# Altium footprint library 00.PcbLib: 150 footprints (part 9 of 10)
Each footprint in its own frame and in the unit in brackets; x right, y up, seen from the top. Pads: shape width x height; smd on the part's side, far side on the other; paste and mask are expansions set on the pad; w line width, h text height; cw(c..) or ccw(c..) is an arc to the next point about the centre after c.
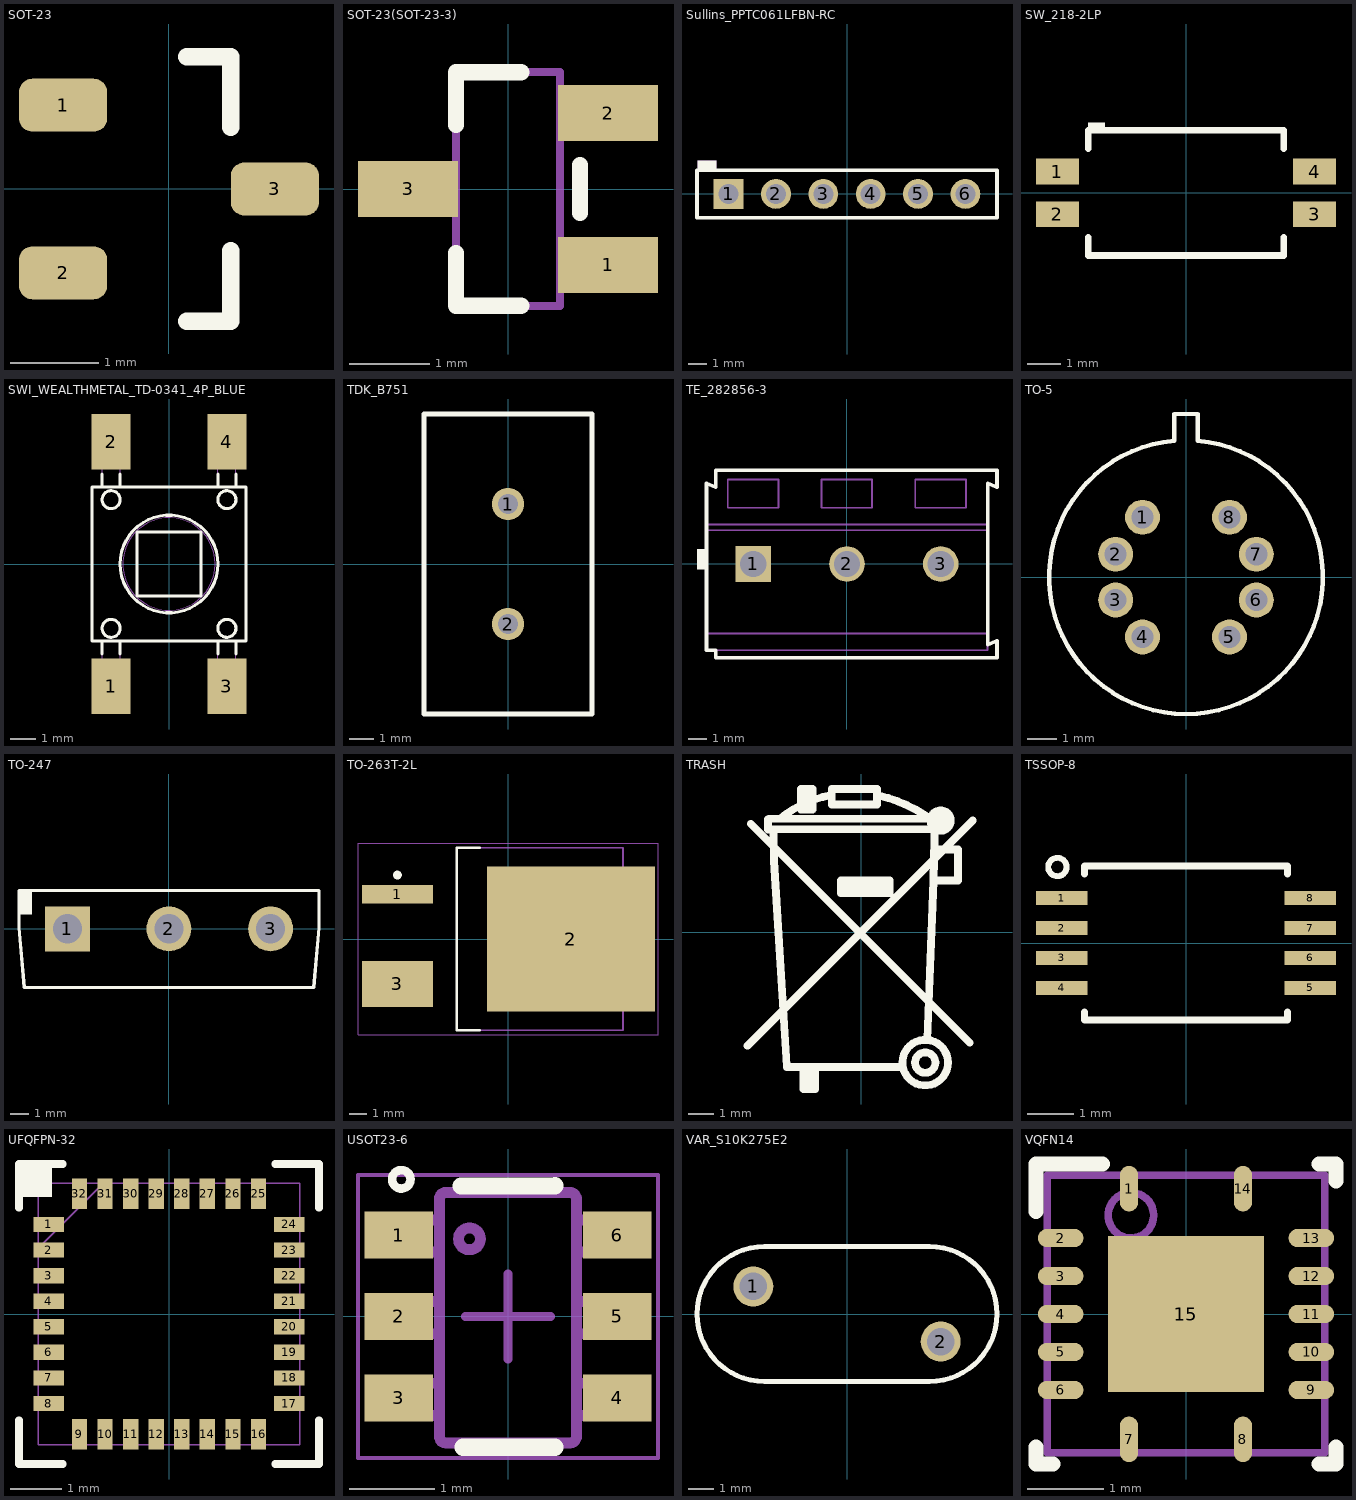
[diagram p8: the footprints below, top view; thin cyan lines are the x and y axes]

## SOT-23 [mm]
pads (3):
  rrect50% 1x0.6 smd: 1(-1.2,0.95) 2(-1.2,-0.95) 3(1.2,0)
Top Overlay:
  lines w0.2: 0.2,-1.5 0.7,-1.5 0.7,-0.7 ; 0.2,1.5 0.7,1.5 0.7,0.7
3D body "SW3dPS-sot-3p290x130ll237h100.STEP": height 1, standoff 0, extent -1.16,-1.45 1.21,1.45

## SOT-23(SOT-23-3) [mm]
height 1.1
pads (3):
  rect 1.25x0.7 smd: 1(1.25,-0.95) 2(1.25,0.95) 3(-1.25,0)
Top Overlay:
  lines w0.2: 0.9,-0.3 0.9,0.3
  lines w0.203: -0.65,-0.8 -0.65,-1.46 0.165,-1.46 ; 0.165,1.46 -0.65,1.46 ; -0.65,0.8 -0.65,1.46 ; -0.65,0.8 -0.65,1.46 ; -0.65,0.8 -0.65,1.46
Top 3D Body:
  lines w0.1: -0.65,-1.46 -0.65,1.46 ; -0.65,-1.46 0.65,-1.46 ; -0.65,-1.46 -0.65,1.46 ; -0.65,-1.46 0.65,-1.46 ; -0.65,-1.46 0.65,-1.46 ; -0.65,-1.46 -0.65,1.46 ; -0.65,1.46 0.65,1.46 ; -0.65,1.46 0.65,1.46 ; -0.65,1.46 0.65,1.46 ; 0.65,-1.46 0.65,1.46 ; 0.65,-1.46 0.65,1.46 ; 0.65,-1.46 0.65,1.46
3D body "SOT-23.step": height 1.3, standoff 0, extent -1.5,-1.5 1.5,1.5

## Sullins_PPTC061LFBN-RC [mm]
pads (6):
  rect 1.6x1.6 hole 1.07: 1(-6.35,0)
  round 1.6 hole 1.07: 2(-3.81,0) 3(-1.27,0) 4(1.27,0) 5(3.81,0) 6(6.35,0)
Top Overlay:
  rectangle: -8.024,1.317 -7.008,1.8
  lines w0.2: -8.045,-1.27 -8.045,1.27 8.045,1.27 8.045,-1.27 -8.045,-1.27
Top Courtyard:
  rectangle: -8.024,1.317 -7.008,1.8
  lines w0.1: -8.045,-1.27 -8.045,1.27 8.045,1.27 8.045,-1.27 -8.045,-1.27
3D body: height 3.3, standoff -3.2, extent 5.96,-0.227 6.772,0.231
3D body: height 3.3, standoff -3.2, extent 3.407,-0.217 4.22,0.24
3D body: height 3.3, standoff -3.2, extent 0.884,-0.237 1.696,0.221
3D body: height 3.3, standoff -3.2, extent -1.676,-0.227 -0.864,0.231
3D body: height 3.3, standoff -3.2, extent -4.216,-0.227 -3.404,0.231
3D body: height 3.3, standoff -3.2, extent -6.77,-0.235 -5.95,0.223
3D body: height 8.53, standoff 8.48, extent 5.842,-0.506 6.858,0.51
3D body: height 8.53, standoff 8.48, extent 3.302,-0.506 4.318,0.51
3D body: height 8.53, standoff 8.48, extent 0.764,-0.516 1.78,0.5
3D body: height 8.53, standoff 8.48, extent -1.778,-0.506 -0.762,0.51
3D body: height 8.5, standoff 0, extent -8.1,-1.3 8.1,1.3
3D body: height 8.53, standoff 8.48, extent -6.856,-0.506 -5.84,0.51
3D body: height 8.53, standoff 8.48, extent -4.318,-0.506 -3.302,0.51

## SW_218-2LP [mm]
pads (4):
  rect 1.27x0.76 smd: 1(-3.81,0.635) 2(-3.81,-0.635) 3(3.81,-0.635) 4(3.81,0.635)
Top Overlay:
  rectangle: -2.899,1.855 -2.399,2.09
  lines w0.2: -2.9,-1.31 -2.9,-1.855 2.9,-1.855 2.9,-1.31 ; -2.9,1.31 -2.9,1.855 2.9,1.855 2.9,1.31
3D body "218-2LPST.stp": height 2.62, standoff 0, extent -4.22,-1.855 4.22,1.855

## SWI_WEALTHMETAL_TD-0341_4P_BLUE [mm]
pads (4):
  rect 1.52x2.16 smd mask+0.05: 1(-2.25,-4.75) 2(-2.25,4.75) 3(2.25,-4.75) 4(2.25,4.75)
Top Overlay:
  circle w0.12: c0,0 r1.9
  circle w0.12: c2.25,-2.5 r0.35
  circle w0.12: c-2.25,-2.5 r0.35
  circle w0.12: c2.25,2.5 r0.35
  circle w0.12: c-2.25,2.5 r0.35
  lines w0.12: -2.6,-3.5 -2.6,-3 ; -2.6,3 -2.6,3.5 ; -1.9,-3.5 -1.9,-3 ; -1.9,3 -1.9,3.5 ; 1.9,-3.5 1.9,-3 ; 1.9,3 1.9,3.5 ; 2.6,-3.5 2.6,-3 ; 2.6,3 2.6,3.5 ; -3,-3 3,-3 3,3 -3,3 -3,-3 ; -1.25,-1.25 -1.25,1.25 1.25,1.25 1.25,-1.25 -1.25,-1.25
Bottom 3D Body:
  circle w0.01: c2.25,-2.5 r0.35
  circle w0.01: c-2.25,-2.5 r0.35
  circle w0.01: c2.25,2.5 r0.35
  circle w0.01: c-2.25,2.5 r0.35
  circle w0.01: c0,0 r1.8
  circle w0.01: c0,0 r1.9
  lines w0.01: -2.6,-3 -2.6,-5.15 -1.9,-5.15 -1.9,-3 ; -2.6,3 -2.6,5.15 -1.9,5.15 -1.9,3 ; 1.9,-3 1.9,-5.15 2.6,-5.15 2.6,-3 ; 1.9,3 1.9,5.15 2.6,5.15 2.6,3 ; -3,-3 -3,3 3,3 3,-3 -3,-3 ; -1.25,-1.25 1.25,-1.25 1.25,1.25 0.45,1.25 -1.25,1.25 -1.25,-1.25
3D body: height 1.1, standoff 0, extent -2.6,4.1 -1.9,4.2
3D body: height 1.2, standoff 1.1, extent -2.6,3 -1.9,4.2
3D body: height 1.1, standoff 0, extent 1.9,4.1 2.6,4.2
3D body: height 1.1, standoff 0, extent 1.9,-4.2 2.6,-4.1
3D body: height 1.1, standoff 0, extent -2.6,-4.2 -1.9,-4.1
3D body: height 1.2, standoff 1.1, extent 1.9,3 2.6,4.2
3D body: height 1.2, standoff 1.1, extent 1.9,-4.2 2.6,-3
3D body: height 1.2, standoff 1.1, extent -2.6,-4.2 -1.9,-3
3D body: height 4.85, standoff 3.7, extent -1.7,-1.696 1.7,1.697
3D body: height 7.55, standoff 5.85, extent -1.2,-1.2 1.2,1.2
3D body: height 5.85, standoff 4.85, extent -1,-1 1,1
3D body: height 3.7, standoff 0, extent -2.999,-2.999 2.999,2.999
3D body: height 0.1, standoff 0, extent -2.6,4.2 -1.9,5.15
3D body: height 0.1, standoff 0, extent 1.9,4.2 2.6,5.15
3D body: height 0.1, standoff 0, extent -2.6,-5.15 -1.9,-4.2
3D body: height 0.1, standoff 0, extent 1.9,-5.15 2.6,-4.2

## TDK_B751 [mm]
pads (2):
  round 1.35 hole 0.85: 1(0,2.5) 2(0,-2.5)
Top Overlay:
  lines w0.2: -3.5,-6.25 -3.5,6.25 3.5,6.25 3.5,-6.25 -3.5,-6.25
3D body: height 4.4, standoff 3.8, extent -2.849,-2.8 -2.252,-2.203
3D body: height 11.1, standoff 4.1, extent -3.483,-3.485 3.483,3.485
3D body: height 2.9, standoff 2.3, extent -2.848,-2.8 -2.251,-2.203
3D body: height 4.1, standoff 2.6, extent -2.85,-2.8 -2.253,-2.201
3D body: height 4.1, standoff 2.6, extent 2.253,2.201 2.85,2.8
3D body: height 4.4, standoff 3.8, extent 2.252,2.203 2.849,2.8
3D body: height 16.49, standoff 4.01, extent -1.5,-6.201 1.5,6.25
3D body: height 0.3, standoff -0.3, extent -0.297,2.201 0.3,2.799
3D body: height 2.83, standoff -0.21, extent -0.248,2.201 2.791,2.8
3D body: height 2.9, standoff 2.3, extent 2.252,2.203 2.849,2.8
3D body: height 0, standoff -2.5, extent -0.297,2.201 0.3,2.8
3D body: height 7.14, standoff 3.89, extent 2.252,-0.502 2.85,2.75
3D body: height 7.14, standoff 3.89, extent -2.85,-2.75 -2.252,0.502
3D body: height 0, standoff -2.5, extent -0.3,-2.8 0.297,-2.201
3D body: height 2.83, standoff -0.21, extent -2.791,-2.8 0.248,-2.201
3D body: height 0.3, standoff -0.3, extent -0.3,-2.799 0.297,-2.201

## TE_282856-3 [mm]
pads (3):
  rect 1.9x1.9 hole 1.4: 1(-5,0)
  round 1.9 hole 1.4: 2(0,0) 3(5,0)
Top Overlay:
  rectangle: -8,-0.3 -7.5,0.8
  lines w0.2: -7.5,-4.6 -7,-4.6 -7,-5 8,-5 8,-4.1 7.5,-4.3 7.5,1.8 7.5,2.1 7.5,4.3 8,4.1 8,5 -7,5 -7,4.1 -7.5,4.3 -7.5,2.1 -7.5,1.8 -7.5,-3.7 -7.5,-4.6
Top Component Outline (Mech100):
  lines w0.1: 7.5,-4.3 8,-4.1 8,-5 -7,-5 -7,-4.6 ; -7.5,-3.7 7.5,-3.7 ; -7.5,-3.7 -7.5,1.8 ; -7.5,-3.7 -7.5,-4.6 -7,-4.6 ; -7.5,1.8 7.5,1.8 ; -7.5,1.8 -7.5,2.1 ; -7.5,2.1 7.5,2.1 ; -7.5,2.1 -7.5,4.3 -7,4.1 -7,5 8,5 8,4.1 7.5,4.3 7.5,2.1 ; -7,-4.6 7.5,-4.6 7.5,-3.7 ; 7.5,-3.7 7.5,1.8 ; 7.5,1.8 7.5,2.1 ; -6.358,3 -6.358,4.5 -3.658,4.5 -3.658,3 -6.358,3 ; -1.358,3 -1.358,4.5 1.342,4.5 1.342,3 -1.358,3 ; 3.642,3 6.342,3 6.342,4.5 3.642,4.5 3.642,3
3D body "c-282856-3-d-3d.stp": height 19, standoff -3.5, extent -7.5,-5 8,5

## TO-5 [mm]
pads (8):
  round 1.2 hole 0.762: 1(-1.493,2.055) 2(-2.416,0.785) 3(-2.416,-0.785) 4(-1.493,-2.055) 5(1.493,-2.055) 6(2.416,-0.785) 7(2.416,0.785) 8(1.493,2.055)
Top Overlay:
  lines w0.152: -0.4,4.7 -0.4,5.6 0.4,5.6 0.4,4.7 ; -0.399,4.683 ccw(c0,0) 0.399,4.683
3D body: height 0.5, standoff 0, extent -0.381,4.572 0.381,5.588
3D body: height 6.61, standoff 0, extent -4.191,-4.191 4.319,4.319
3D body: height 0.5, standoff 0, extent -4.7,-4.697 4.7,4.697

## TO-247 [mil]
pads (3):
  rect 95x95 hole 62: 1(-215,0)
  round 95 / inner round 74.8 / far side round 96 hole 62: 2(0,0) 3(215,0)
Top Overlay:
  rectangle: -317.51,30 -290,81.11
  lines w7: -317.51,2.37 -306.45,-124.01 306.47,-124.01 317.53,2.37 317.53,81.11 -317.51,81.11 -317.51,2.37
3D body "TO-274.stp": height 1007.29, standoff -623.42, extent -317.51,-124.01 317.53,81.11

## TO-263T-2L [mm] "D2-PAK, 3-Pads, Body 7.80x8.50mm (max), IPC Medium Density"
height 4.57
pads (3):
  rect 4x1.05 smd: 1(-6.25,2.54)
  rect 9.5x8.2 smd paste+0: 2(3.55,0)
  rect 4x2.6 smd: 3(-6.25,-2.54)
Top Overlay:
  circle w0.25: c-6.25,3.615 r0.125
  lines w0.15: -1.6,-5.15 -2.9,-5.15 -2.9,5.15 -1.6,5.15
Top 3D Body:
  lines w0.1: -2.9,-5.15 -2.9,5.15 6.5,5.15 6.5,-5.15 -2.9,-5.15
Mechanical 15:
  lines w0.05: -8.475,-5.4 -8.475,5.4 8.475,5.4 8.475,-5.4 -8.475,-5.4
  lines w0.1: -0.5,0 0.5,0 ; 0,-0.5 0,0.5
3D body "TO-263T-2L.step": height 4.82, standoff 0, extent -7.115,-5.15 8.125,5.15

## TRASH [mm]
Top Overlay:
  lines w0.305: -4.478,-4.478 4.412,4.412 ; -4.351,4.285 4.285,-4.351 ; -3.671,4.462 -3.671,4.061 2.862,4.081 ; -3.64,4.488 2.761,4.488 ; -3.457,4.061 -3.437,2.811 -2.929,-5.266 ; -3.183,4.488 cw(c-0.553,1.391) -1.202,5.402 ; -2.929,-5.317 1.592,-5.317 ; -2.726,-5.317 -2.269,-5.317 -2.269,-6.18 -1.811,-6.18 -1.811,-5.317 ; -2.167,4.945 -2.167,5.656 -2.116,5.656 ; -2.065,-6.18 -2.065,-5.317 ; -1.151,5.656 -1.151,5.047 0.627,5.047 0.627,5.656 -1.1,5.656 ; -0.795,1.795 1.135,1.795 ; 0.678,5.402 cw(c-0.555,-0.105) 2.862,4.386 ; 2.608,-4.25 2.862,2.049 ; 2.913,3.269 3.827,3.269 3.827,2.049 2.862,2.049 ; 2.913,4.488 2.862,2.049 ; 2.964,4.488 2.964,4.539 cw(c3.116,4.539) 3.269,4.539 3.269,4.335 cw(c3.167,4.335) 3.065,4.335 3.065,4.386 ; -2.37,4.843 -1.913,4.843 -1.913,5.656 -2.37,5.656 -2.37,4.843 ; -0.795,1.541 -0.795,2.049 1.135,2.049 1.135,1.541 -0.795,1.541 ; 1.633,-5.139 ccw(c2.532,-5.139) 3.431,-5.139 ccw(c2.532,-5.139) 1.633,-5.139 ; 2.131,-5.139 ccw(c2.532,-5.139) 2.933,-5.139 ccw(c2.532,-5.139) 2.131,-5.139 ; 2.74,4.412 ccw(c3.142,4.412) 3.543,4.412 ccw(c3.142,4.412) 2.74,4.412

## TSSOP-8 [mm]
pads (8):
  rect 1.118x0.3 smd paste+0 mask+0: 1(-2.7,0.975) 2(-2.7,0.325) 3(-2.7,-0.325) 4(-2.7,-0.975) 5(2.7,-0.975) 6(2.7,-0.325) 7(2.7,0.325) 8(2.7,0.975)
Top Overlay:
  circle w0.127: c-2.794,1.651 r0.2
  lines w0.152: -2.2,-1.498 -2.2,-1.676 2.2,-1.676 2.2,-1.498 ; -2.2,1.498 -2.2,1.676 2.2,1.676 2.2,1.498
3D body "User Library-TSS0P8.STEP": height 1.09, standoff 0, extent -3.14,-1.575 3.14,1.425

## UFQFPN-32 [mm]
pads (32):
  rect 0.6x0.3 smd paste-0.15 mask+0: 1(-2.35,1.75) 2(-2.35,1.25) 3(-2.35,0.75) 4(-2.35,0.25) 5(-2.35,-0.25) 6(-2.35,-0.75) 7(-2.35,-1.25) 8(-2.35,-1.75) 17(2.35,-1.75) 18(2.35,-1.25) 19(2.35,-0.75) 20(2.35,-0.25) 21(2.35,0.25) 22(2.35,0.75) 23(2.35,1.25) 24(2.35,1.75)
  rect 0.3x0.6 smd paste-0.15 mask+0: 9(-1.75,-2.35) 10(-1.25,-2.35) 11(-0.75,-2.35) 12(-0.25,-2.35) 13(0.25,-2.35) 14(0.75,-2.35) 15(1.25,-2.35) 16(1.75,-2.35) 25(1.75,2.35) 26(1.25,2.35) 27(0.75,2.35) 28(0.25,2.35) 29(-0.25,2.35) 30(-0.75,2.35) 31(-1.25,2.35) 32(-1.75,2.35)
Top Overlay:
  rectangle: -2.931,2.286 -2.286,2.931
  lines w0.152: -2.931,-2.078 -2.931,-2.931 -2.078,-2.931 ; -2.931,2.078 -2.931,2.931 -2.078,2.931 ; 2.078,-2.931 2.931,-2.931 2.931,-2.078 ; 2.078,2.931 2.931,2.931 2.931,2.078
Top Paste:
  region: -1.6,2.65 -1.9,2.65 -1.9,2.05 -1.6,2.05
  region: -1.1,2.65 -1.4,2.65 -1.4,2.05 -1.1,2.05
  region: -0.6,2.65 -0.9,2.65 -0.9,2.05 -0.6,2.05
  region: -0.1,2.65 -0.4,2.65 -0.4,2.05 -0.1,2.05
  region: 0.4,2.65 0.1,2.65 0.1,2.05 0.4,2.05
  region: 0.9,2.65 0.6,2.65 0.6,2.05 0.9,2.05
  region: 1.4,2.65 1.1,2.65 1.1,2.05 1.4,2.05
  region: 1.9,2.65 1.6,2.65 1.6,2.05 1.9,2.05
  region: 2.65,1.9 2.05,1.9 2.05,1.6 2.65,1.6
  region: 2.65,1.4 2.05,1.4 2.05,1.1 2.65,1.1
  region: 2.65,0.9 2.05,0.9 2.05,0.6 2.65,0.6
  region: 2.65,0.4 2.05,0.4 2.05,0.1 2.65,0.1
  region: 2.65,-0.1 2.05,-0.1 2.05,-0.4 2.65,-0.4
  region: 2.65,-0.6 2.05,-0.6 2.05,-0.9 2.65,-0.9
  region: 2.65,-1.1 2.05,-1.1 2.05,-1.4 2.65,-1.4
  region: 2.65,-1.6 2.05,-1.6 2.05,-1.9 2.65,-1.9
  region: 1.9,-2.05 1.6,-2.05 1.6,-2.65 1.9,-2.65
  region: 1.4,-2.05 1.1,-2.05 1.1,-2.65 1.4,-2.65
  region: 0.9,-2.05 0.6,-2.05 0.6,-2.65 0.9,-2.65
  region: 0.4,-2.05 0.1,-2.05 0.1,-2.65 0.4,-2.65
  region: -0.1,-2.05 -0.4,-2.05 -0.4,-2.65 -0.1,-2.65
  region: -0.6,-2.05 -0.9,-2.05 -0.9,-2.65 -0.6,-2.65
  region: -1.1,-2.05 -1.4,-2.05 -1.4,-2.65 -1.1,-2.65
  region: -1.6,-2.05 -1.9,-2.05 -1.9,-2.65 -1.6,-2.65
  region: -2.05,-1.6 -2.65,-1.6 -2.65,-1.9 -2.05,-1.9
  region: -2.05,-1.1 -2.65,-1.1 -2.65,-1.4 -2.05,-1.4
  region: -2.05,-0.6 -2.65,-0.6 -2.65,-0.9 -2.05,-0.9
  region: -2.05,-0.1 -2.65,-0.1 -2.65,-0.4 -2.05,-0.4
  region: -2.05,0.4 -2.65,0.4 -2.65,0.1 -2.05,0.1
  region: -2.05,0.9 -2.65,0.9 -2.65,0.6 -2.05,0.6
  region: -2.05,1.4 -2.65,1.4 -2.65,1.1 -2.05,1.1
  region: -2.05,1.9 -2.65,1.9 -2.65,1.6 -2.05,1.6
Top Solder:
  region: -1.6,2.65 -1.9,2.65 -1.9,2.05 -1.6,2.05
  region: -1.1,2.65 -1.4,2.65 -1.4,2.05 -1.1,2.05
  region: -0.6,2.65 -0.9,2.65 -0.9,2.05 -0.6,2.05
  region: -0.1,2.65 -0.4,2.65 -0.4,2.05 -0.1,2.05
  region: 0.4,2.65 0.1,2.65 0.1,2.05 0.4,2.05
  region: 0.9,2.65 0.6,2.65 0.6,2.05 0.9,2.05
  region: 1.4,2.65 1.1,2.65 1.1,2.05 1.4,2.05
  region: 1.9,2.65 1.6,2.65 1.6,2.05 1.9,2.05
  region: 2.65,1.9 2.05,1.9 2.05,1.6 2.65,1.6
  region: 2.65,1.4 2.05,1.4 2.05,1.1 2.65,1.1
  region: 2.65,0.9 2.05,0.9 2.05,0.6 2.65,0.6
  region: 2.65,0.4 2.05,0.4 2.05,0.1 2.65,0.1
  region: 2.65,-0.1 2.05,-0.1 2.05,-0.4 2.65,-0.4
  region: 2.65,-0.6 2.05,-0.6 2.05,-0.9 2.65,-0.9
  region: 2.65,-1.1 2.05,-1.1 2.05,-1.4 2.65,-1.4
  region: 2.65,-1.6 2.05,-1.6 2.05,-1.9 2.65,-1.9
  region: 1.9,-2.05 1.6,-2.05 1.6,-2.65 1.9,-2.65
  region: 1.4,-2.05 1.1,-2.05 1.1,-2.65 1.4,-2.65
  region: 0.9,-2.05 0.6,-2.05 0.6,-2.65 0.9,-2.65
  region: 0.4,-2.05 0.1,-2.05 0.1,-2.65 0.4,-2.65
  region: -0.1,-2.05 -0.4,-2.05 -0.4,-2.65 -0.1,-2.65
  region: -0.6,-2.05 -0.9,-2.05 -0.9,-2.65 -0.6,-2.65
  region: -1.1,-2.05 -1.4,-2.05 -1.4,-2.65 -1.1,-2.65
  region: -1.6,-2.05 -1.9,-2.05 -1.9,-2.65 -1.6,-2.65
  region: -2.05,-1.6 -2.65,-1.6 -2.65,-1.9 -2.05,-1.9
  region: -2.05,-1.1 -2.65,-1.1 -2.65,-1.4 -2.05,-1.4
  region: -2.05,-0.6 -2.65,-0.6 -2.65,-0.9 -2.05,-0.9
  region: -2.05,-0.1 -2.65,-0.1 -2.65,-0.4 -2.05,-0.4
  region: -2.05,0.4 -2.65,0.4 -2.65,0.1 -2.05,0.1
  region: -2.05,0.9 -2.65,0.9 -2.65,0.6 -2.05,0.6
  region: -2.05,1.4 -2.65,1.4 -2.65,1.1 -2.05,1.1
  region: -2.05,1.9 -2.65,1.9 -2.65,1.6 -2.05,1.6
Top Component Outline (Mech100):
  lines w0.025: -2.55,1.28 -1.28,2.55 ; -2.55,-2.55 -2.55,2.55 2.55,2.55 2.55,-2.55 -2.55,-2.55
3D body "UFQFPN-32.step": height 1.4, standoff 0, extent -2.601,-2.601 2.601,2.601

## USOT23-6 [mm]
pads (6):
  rect 0.8x0.55 smd paste+0 mask+0.051: 1(-1.275,0.95) 2(-1.275,0) 3(-1.275,-0.95) 4(1.275,-0.95) 5(1.275,0) 6(1.275,0.95)
Top Overlay:
  circle w0.1: c-1.245,1.6 r0.108
  lines w0.2: -0.55,1.524 0.55,1.525 ; -0.525,-1.525 0.55,-1.525
Top 3D Body:
  lines w0.127: 0.724,-1.475 ccw(c0.723,-1.399) 0.8,-1.399 0.8,1.37 ccw(c0.723,1.37) 0.724,1.446 ; 0.723,-1.475 0.724,-1.475 ; 0.723,-1.475 -0.724,-1.475 -0.725,-1.475 cw(c-0.724,-1.399) -0.801,-1.399 -0.801,1.37 cw(c-0.724,1.37) -0.725,1.446 -0.724,1.446 0.723,1.446 ; 0.723,1.446 0.724,1.446 ; -1.423,-1.154 -1.206,-1.154 -1.113,-1.154 -1.081,-1.154 -0.828,-1.154 -0.801,-1.154 -0.801,-0.78 -0.828,-0.78 -1.081,-0.78 -1.113,-0.78 -1.206,-0.78 -1.423,-0.78 -1.423,-1.154 ; -1.423,-0.202 -1.206,-0.202 -1.113,-0.202 -1.081,-0.202 -0.828,-0.202 -0.801,-0.202 -0.801,0.173 -0.828,0.173 -1.081,0.173 -1.113,0.173 -1.206,0.173 -1.423,0.173 -1.423,-0.202 ; -1.423,0.751 -1.206,0.751 -1.113,0.751 -1.081,0.751 -0.828,0.751 -0.801,0.751 -0.801,1.125 -0.828,1.125 -1.081,1.125 -1.113,1.125 -1.206,1.125 -1.423,1.125 -1.423,0.751 ; -0.577,0.906 cw(c-0.45,0.906) -0.323,0.906 cw(c-0.45,0.906) -0.577,0.906 ; 0.8,-1.154 0.827,-1.154 1.08,-1.154 1.112,-1.154 1.205,-1.154 1.422,-1.154 1.422,-0.78 1.205,-0.78 1.112,-0.78 1.08,-0.78 0.827,-0.78 0.8,-0.78 0.8,-1.154 ; 0.8,-0.202 0.827,-0.202 1.08,-0.202 1.112,-0.202 1.205,-0.202 1.422,-0.202 1.422,0.173 1.205,0.173 1.112,0.173 1.08,0.173 0.827,0.173 0.8,0.173 0.8,-0.202 ; 0.8,0.751 0.827,0.751 1.08,0.751 1.112,0.751 1.205,0.751 1.422,0.751 1.422,1.125 1.205,1.125 1.112,1.125 1.08,1.125 0.827,1.125 0.8,1.125 0.8,0.751
Top Component Outline (Mech100):
  lines w0.05: -1.75,-1.65 1.75,-1.65 1.75,1.65 -1.75,1.65 -1.75,-1.65
  lines w0.1: -0.5,0 0.5,0 ; 0,-0.5 0,0.5
3D body "DDC0006A.stp": height 0.92, standoff 0, extent -1.434,-1.485 1.434,1.485

## VAR_S10K275E2 [mm]
pads (2):
  round 1.6 hole 1.1: 1(-3.75,1.1) 2(3.75,-1.1)
Top Overlay:
  lines w0.2: -3.3,-2.7 cw(c-3.3,0) -3.3,2.7 3.3,2.7 cw(c3.3,0) 3.3,-2.7 -3.3,-2.7
3D body: height 14.99, standoff 3.01, extent -5.976,-2.7 5.976,2.7
3D body: height 7, standoff -3, extent 3.328,-1.524 4.175,-0.676
3D body: height 7, standoff -3, extent -4.172,0.676 -3.325,1.524

## VQFN14 [mm]
pads (15):
  oval 0.24x0.6 smd paste+0 mask+0.051: 1(-0.75,1.65) 7(-0.75,-1.65) 8(0.75,-1.65) 14(0.75,1.65)
  oval 0.6x0.24 smd paste+0 mask+0.051: 2(-1.65,1) 3(-1.65,0.5) 4(-1.65,0) 5(-1.65,-0.5) 6(-1.65,-1) 9(1.65,-1) 10(1.65,-0.5) 11(1.65,0) 12(1.65,0.5) 13(1.65,1)
  rect 2.05x2.05 smd paste-1.025 mask+0.051: 15(0,0)
Top Overlay:
  lines w0.2: -1.975,-1.75 -1.975,-1.975 -1.75,-1.975 ; -1.975,1.35 -1.975,1.975 -1.1,1.975 ; 1.75,-1.975 1.975,-1.975 1.975,-1.75 ; 1.75,1.975 1.975,1.975 1.975,1.75
Top Paste:
  region: -0.1,0.1 -0.1,1.017 -1.017,1.017 -1.017,0.1
  region: -0.1,-1.017 -0.1,-0.1 -1.017,-0.1 -1.017,-1.017
  region: 0.1,-0.1 0.1,-1.017 1.017,-1.017 1.017,-0.1
  region: 0.1,1.017 0.1,0.1 1.017,0.1 1.017,1.017
Top Component Outline (Mech100):
  circle w0.1: c-0.725,1.3 r0.3
  lines w0.1: -1.825,-1.825 1.825,-1.825 1.825,1.825 -1.825,1.825 -1.825,-1.825
3D body: height 1, standoff 0, extent -1.825,-1.825 1.825,1.825